# Altium footprint library Circuitos Integrados.PcbLib: 81 footprints (part 5 of 6)
Each footprint in its own frame and in the unit in brackets; x right, y up, seen from the top. Pads: shape width x height; smd on the part's side, far side on the other; paste and mask are expansions set on the pad; w line width, h text height; cw(c..) or ccw(c..) is an arc to the next point about the centre after c.
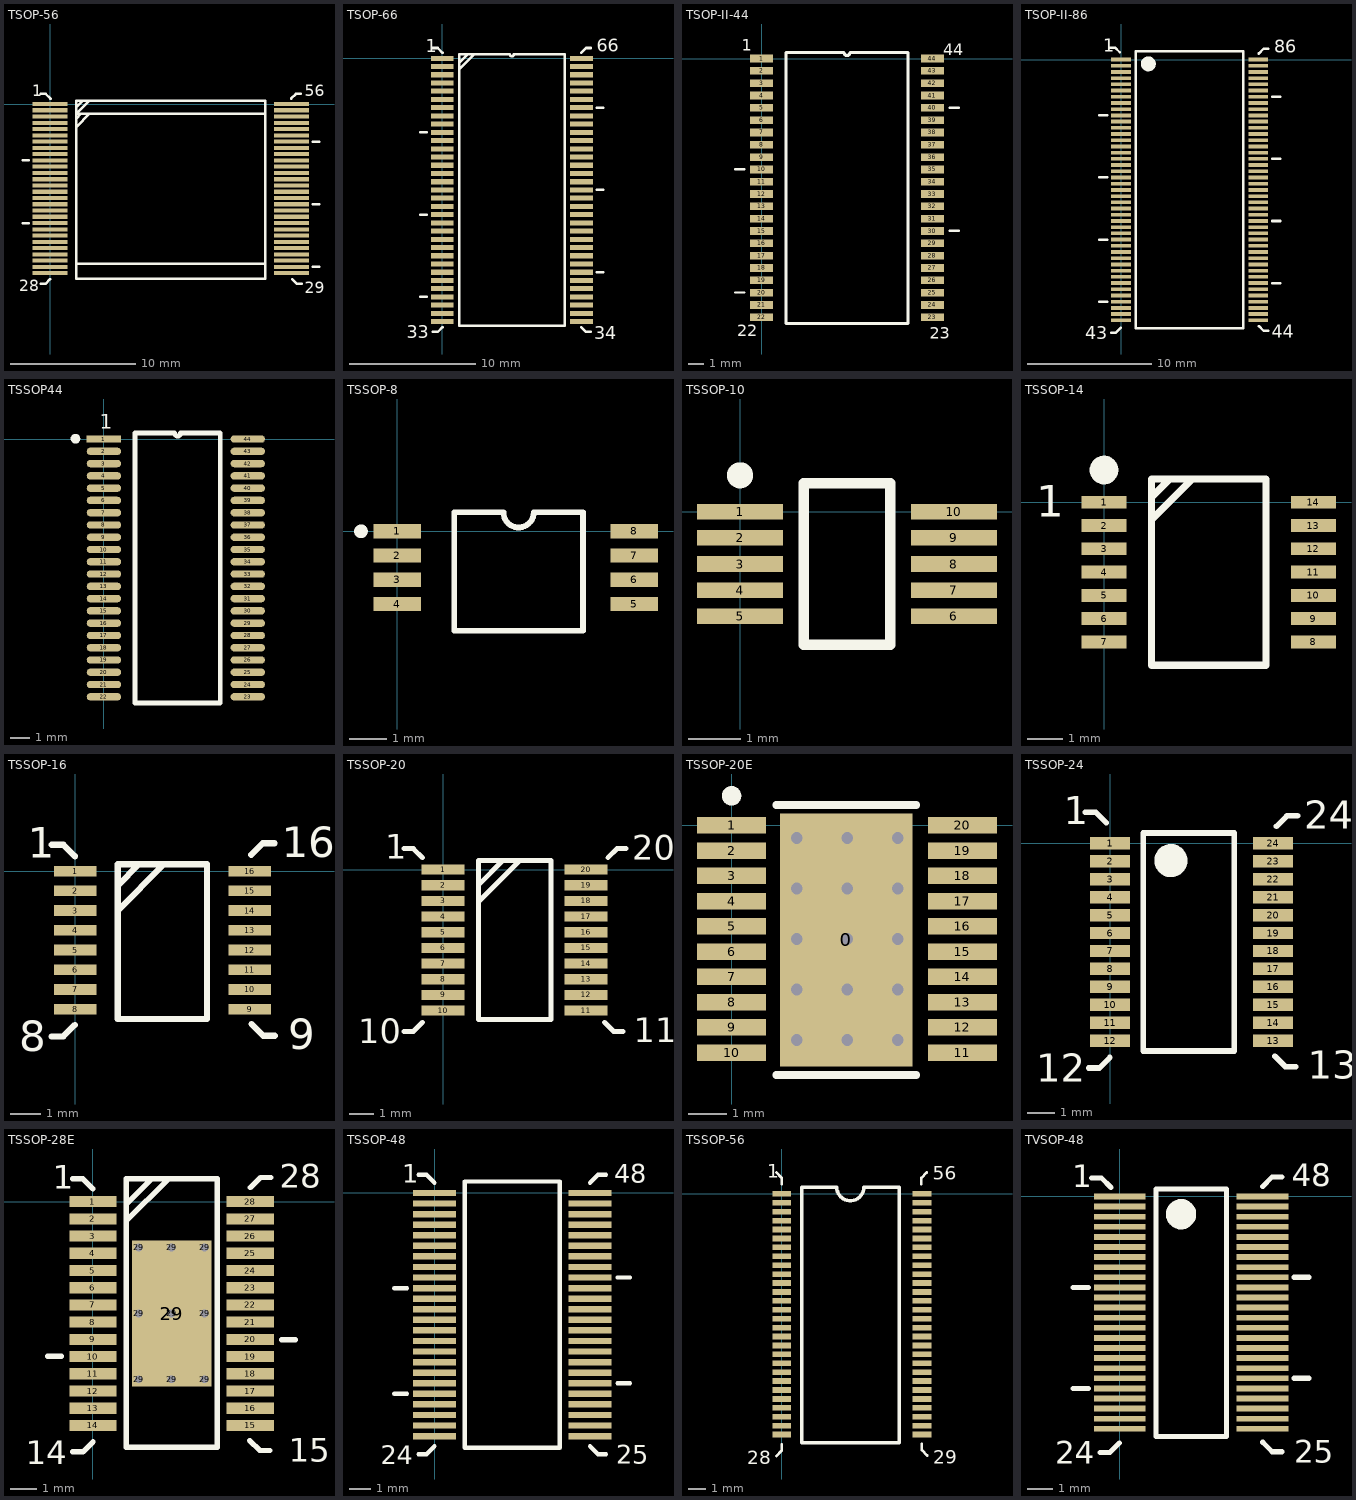
[diagram p4: the footprints below, top view; thin cyan lines are the x and y axes]

## TSOP-56 [mm]
pads (56):
  rect 2.8x0.33 smd: 1(0,0) 2(0,-0.5) 3(0,-1) 4(0,-1.5) 5(0,-2) 6(0,-2.5) 7(0,-3) 8(0,-3.5) 9(0,-4) 10(0,-4.5) 11(0,-5) 12(0,-5.5) 13(0,-6) 14(0,-6.5) 15(0,-7) 16(0,-7.5) 17(0,-8) 18(0,-8.5) 19(0,-9) 20(0,-9.5) 21(0,-10) 22(0,-10.5) 23(0,-11) 24(0,-11.5) 25(0,-12) 26(0,-12.5) 27(0,-13) 28(0,-13.5) 29(19.25,-13.5) 30(19.25,-13) 31(19.25,-12.5) 32(19.25,-12) 33(19.25,-11.5) 34(19.25,-11) 35(19.25,-10.5) 36(19.25,-10) 37(19.25,-9.5) 38(19.25,-9) 39(19.25,-8.5) 40(19.25,-8) 41(19.25,-7.5) 42(19.25,-7) 43(19.25,-6.5) 44(19.25,-6) 45(19.25,-5.5) 46(19.25,-5) 47(19.25,-4.5) 48(19.25,-4) 49(19.25,-3.5) 50(19.25,-3) 51(19.25,-2.5) 52(19.25,-2) 53(19.25,-1.5) 54(19.25,-1) 55(19.25,-0.5) 56(19.25,0)
Top Overlay:
  lines w0.203: -2.204,-9.5 -1.696,-9.5 ; -2.204,-4.5 -1.696,-4.5 ; -0.762,-14.351 -0.381,-14.351 0,-13.97 ; -0.737,0.813 -0.356,0.813 0.025,0.432 ; 2.085,-1.829 3.142,-0.772 ; 2.085,-1.168 2.481,-0.772 ; 2.085,-0.254 2.593,0.254 ; 2.093,-12.741 17.104,-12.741 ; 3.101,0.254 2.085,-0.762 17.146,-0.762 ; 17.145,0.254 2.085,0.25 2.085,-11.75 2.083,-13.945 17.17,-13.945 17.165,-11.75 17.165,0.25 ; 19.225,0.432 19.606,0.813 19.987,0.813 ; 19.304,-13.97 19.685,-14.351 20.066,-14.351 ; 20.946,-13 21.454,-13 ; 20.946,-8 21.454,-8 ; 20.946,-3 21.454,-3
  text "56" at 20.32,0.635 h0.89
  text "29" at 20.32,-15.088 h0.89
  text "1" at -1.422,0.635 h0.89
  text "28" at -2.489,-14.961 h0.89
3D body "TSOP-48.STEP": height 1.2, standoff -0.06, extent -0.65,-12.8 19.45,-0.7

## TSOP-66 [mm]
pads (66):
  rect 1.8x0.4 smd: 1(0,0) 2(0,-0.65) 3(0,-1.3) 4(0,-1.95) 5(0,-2.6) 6(0,-3.25) 7(0,-3.9) 8(0,-4.55) 9(0,-5.2) 10(0,-5.85) 11(0,-6.5) 12(0,-7.15) 13(0,-7.8) 14(0,-8.45) 15(0,-9.1) 16(0,-9.75) 17(0,-10.4) 18(0,-11.05) 19(0,-11.7) 20(0,-12.35) 21(0,-13) 22(0,-13.65) 23(0,-14.3) 24(0,-14.95) 25(0,-15.6) 26(0,-16.25) 27(0,-16.9) 28(0,-17.55) 29(0,-18.2) 30(0,-18.85) 31(0,-19.5) 32(0,-20.15) 33(0,-20.8) 34(11,-20.8) 35(11,-20.15) 36(11,-19.5) 37(11,-18.85) 38(11,-18.2) 39(11,-17.55) 40(11,-16.9) 41(11,-16.25) 42(11,-15.6) 43(11,-14.95) 44(11,-14.3) 45(11,-13.65) 46(11,-13) 47(11,-12.35) 48(11,-11.7) 49(11,-11.05) 50(11,-10.4) 51(11,-9.75) 52(11,-9.1) 53(11,-8.45) 54(11,-7.8) 55(11,-7.15) 56(11,-6.5) 57(11,-5.85) 58(11,-5.2) 59(11,-4.55) 60(11,-3.9) 61(11,-3.25) 62(11,-2.6) 63(11,-1.95) 64(11,-1.3) 65(11,-0.65) 66(11,0)
Top Overlay:
  lines w0.2: 1.335,-0.88 2.54,0.325 ; 1.335,-0.372 2.032,0.325 ; 1.335,-21.125 9.665,-21.125 9.665,0.325 5.662,0.325 cw(c5.5,0.325) 5.337,0.325 1.335,0.325 1.335,-21.125
  lines w0.203: -1.722,-18.85 -1.214,-18.85 ; -1.722,-12.35 -1.214,-12.35 ; -1.722,-5.85 -1.214,-5.85 ; -0.737,-21.613 -0.356,-21.613 0.025,-21.232 ; -0.737,0.813 -0.356,0.813 0.025,0.432 ; 10.975,-21.232 11.356,-21.613 11.737,-21.613 ; 10.975,0.432 11.356,0.813 11.737,0.813 ; 12.214,-16.9 12.722,-16.9 ; 12.214,-10.4 12.722,-10.4 ; 12.214,-3.9 12.722,-3.9
  text "66" at 12.192,0.508 h1.02
  text "34" at 12.014,-22.174 h1.02
  text "1" at -1.295,0.483 h1.02
  text "33" at -2.819,-22.123 h1.02
3D body "TSOP-66.STEP": height 1.2, standoff 0, extent -0.355,-21.545 11.405,0.675

## TSOP-II-44 [mm]
pads (44):
  rect 1.5x0.5 smd: 1(0,0) 2(0,-0.8) 3(0,-1.6) 4(0,-2.4) 5(0,-3.2) 6(0,-4) 7(0,-4.8) 8(0,-5.6) 9(0,-6.4) 10(0,-7.2) 11(0,-8) 12(0,-8.8) 13(0,-9.6) 14(0,-10.4) 15(0,-11.2) 16(0,-12) 17(0,-12.8) 18(0,-13.6) 19(0,-14.4) 20(0,-15.2) 21(0,-16) 22(0,-16.8) 23(11.1,-16.8) 24(11.1,-16) 25(11.1,-15.2) 26(11.1,-14.4) 27(11.1,-13.6) 28(11.1,-12.8) 29(11.1,-12) 30(11.1,-11.2) 31(11.1,-10.4) 32(11.1,-9.6) 33(11.1,-8.8) 34(11.1,-8) 35(11.1,-7.2) 36(11.1,-6.4) 37(11.1,-5.6) 38(11.1,-4.8) 39(11.1,-4) 40(11.1,-3.2) 41(11.1,-2.4) 42(11.1,-1.6) 43(11.1,-0.8) 44(11.1,0)
Top Overlay:
  lines w0.152: -1.727,-15.188 -1.118,-15.188 ; -1.727,-7.188 -1.118,-7.188 ; 12.218,-11.188 12.827,-11.188 ; 12.218,-3.188 12.827,-3.188
  lines w0.2: 1.585,-17.2 9.515,-17.2 9.515,0.4 5.75,0.4 cw(c5.55,0.4) 5.35,0.4 1.585,0.4 1.585,-17.2
  text "1" at -1.27,0.508 h0.76
  text "22" at -1.575,-18.034 h0.76
  text "44" at 11.786,0.229 h0.76
  text "23" at 10.922,-18.212 h0.76
3D body "User Library-44L-TSOP2.step": height 1.08, standoff -0.02, extent -0.285,-17.61 11.475,0.81

## TSOP-II-86 [mm] "TSSOP, 86-Leads, Body 22,3x10,2mm (max), Pitch 0,50mm, IPC Medium Density"
height 1.2
pads (86):
  rect 1.6x0.3 smd: 1(0,0) 2(0,-0.5) 3(0,-1) 4(0,-1.5) 5(0,-2) 6(0,-2.5) 7(0,-3) 8(0,-3.5) 9(0,-4) 10(0,-4.5) 11(0,-5) 12(0,-5.5) 13(0,-6) 14(0,-6.5) 15(0,-7) 16(0,-7.5) 17(0,-8) 18(0,-8.5) 19(0,-9) 20(0,-9.5) 21(0,-10) 22(0,-10.5) 23(0,-11) 24(0,-11.5) 25(0,-12) 26(0,-12.5) 27(0,-13) 28(0,-13.5) 29(0,-14) 30(0,-14.5) 31(0,-15) 32(0,-15.5) 33(0,-16) 34(0,-16.5) 35(0,-17) 36(0,-17.5) 37(0,-18) 38(0,-18.5) 39(0,-19) 40(0,-19.5) 41(0,-20) 42(0,-20.5) 43(0,-21) 44(11.05,-21) 45(11.05,-20.5) 46(11.05,-20) 47(11.05,-19.5) 48(11.05,-19) 49(11.05,-18.5) 50(11.05,-18) 51(11.05,-17.5) 52(11.05,-17) 53(11.05,-16.5) 54(11.05,-16) 55(11.05,-15.5) 56(11.05,-15) 57(11.05,-14.5) 58(11.05,-14) 59(11.05,-13.5) 60(11.05,-13) 61(11.05,-12.5) 62(11.05,-12) 63(11.05,-11.5) 64(11.05,-11) 65(11.05,-10.5) 66(11.05,-10) 67(11.05,-9.5) 68(11.05,-9) 69(11.05,-8.5) 70(11.05,-8) 71(11.05,-7.5) 72(11.05,-7) 73(11.05,-6.5) 74(11.05,-6) 75(11.05,-5.5) 76(11.05,-5) 77(11.05,-4.5) 78(11.05,-4) 79(11.05,-3.5) 80(11.05,-3) 81(11.05,-2.5) 82(11.05,-2) 83(11.05,-1.5) 84(11.05,-1) 85(11.05,-0.5) 86(11.05,0)
Top Overlay:
  circle w0.6: c2.2,-0.35 r0.3
  lines w0.2: 1.2,-21.65 9.85,-21.65 9.85,0.65 1.2,0.65 1.2,-21.65
  lines w0.203: -1.753,-19.496 -1.118,-19.496 ; -1.753,-14.496 -1.118,-14.496 ; -1.753,-9.496 -1.118,-9.496 ; -1.753,-4.496 -1.118,-4.496 ; -0.864,0.965 -0.483,0.965 -0.102,0.584 ; -0.787,-21.994 -0.406,-21.994 -0.025,-21.613 ; 11.102,-21.46 11.483,-21.841 11.864,-21.841 ; 11.102,0.483 11.483,0.864 11.864,0.864 ; 12.168,-18.004 12.803,-18.004 ; 12.168,-13.004 12.803,-13.004 ; 12.168,-8.004 12.803,-8.004 ; 12.168,-3.004 12.803,-3.004
  text "86" at 12.319,0.559 h1.02
  text "44" at 12.141,-22.403 h1.02
  text "1" at -1.422,0.635 h1.02
  text "43" at -2.87,-22.504 h1.02
3D body "User Library-TSOP-86.STEP": height 1.06, standoff -0.03, extent -0.359,-21.487 11.43,0.507

## TSSOP44 [mil]
pads (44):
  rect 70x15 smd: 1(0,0)
  oval 70x15 smd: 2(0,-25) 3(0,-50) 4(0,-75) 5(0,-100) 6(0,-125) 7(0,-150) 8(0,-175) 9(0,-200) 10(0,-225) 11(0,-250) 12(0,-275) 13(0,-300) 14(0,-325) 15(0,-350) 16(0,-375) 17(0,-400) 18(0,-425) 19(0,-450) 20(0,-475) 21(0,-500) 22(0,-525) 23(293,-525) 24(293,-500) 25(293,-475) 26(293,-450) 27(293,-425) 28(293,-400) 29(293,-375) 30(293,-350) 31(293,-325) 32(293,-300) 33(293,-275) 34(293,-250) 35(293,-225) 36(293,-200) 37(293,-175) 38(293,-150) 39(293,-125) 40(293,-100) 41(293,-75) 42(293,-50) 43(293,-25) 44(293,0)
Top Overlay:
  circle w9.84: c-58,0.68 r4.92
  lines w10: 63,-537.5 237,-537.5 237,12.5 156.25,12.5 cw(c150,12.5) 143.75,12.5 63,12.5 63,-537.5
  text "1" at -8,21 h30
3D body "User Library-HTSSOP44-0_65.STEP": height 47.24, standoff 0, extent -17,-539.56 309.77,15.55

## TSSOP-8 [mil] "TSSOP, 8-Leads, Body 3,1x4,5mm (max), Pitch 0,65mm, IPC Low Density"
height 43.31
pads (8):
  rect 50x15 smd: 1(0,0) 2(0,-25.6) 3(0,-51.2) 4(0,-76.8) 5(250,-76.8) 6(250,-51.2) 7(250,-25.6) 8(250,0)
Top Overlay:
  circle w8: c-38.16,0 r3.16
  lines w6: 60,19 60,-105 196,-105 196,19 ; 60,20 112,20 ccw(c128,20) 144,20 196,20
3D body "TSS0P8-1.STEP": height 43, standoff 0, extent 2.38,-101.11 249.62,17

## TSSOP-10 [mm]
height 1.1
pads (10):
  rect 1.65x0.3 smd: 1(0,0) 2(0,-0.5) 3(0,-1) 4(0,-1.5) 5(0,-2) 6(4.1,-2) 7(4.1,-1.5) 8(4.1,-1) 9(4.1,-0.5) 10(4.1,0)
Top Overlay:
  circle w0.25: c0,0.7 r0.125
  lines w0.2: 1.225,-2.55 2.875,-2.55 2.875,0.55 1.225,0.55 1.225,-2.55
3D body "SW3dPS-TSSOP-10.STEP": height 1.1, standoff 0, extent -0.45,-2.5 4.55,0.5

## TSSOP-14 [mm] "TSSOP, 14-Leads, Pitch 0.65mm"
pads (14):
  rect 1.26x0.36 smd: 1(0,0) 2(0,-0.65) 3(0,-1.3) 4(0,-1.95) 5(0,-2.6) 6(0,-3.25) 7(0,-3.9) 8(5.85,-3.9) 9(5.85,-3.25) 10(5.85,-2.6) 11(5.85,-1.95) 12(5.85,-1.3) 13(5.85,-0.65) 14(5.85,0)
Top Overlay:
  circle w0.4: c0,0.9 r0.2
  lines w0.203: 1.325,-0.493 2.468,0.65 ; 1.325,0.142 1.833,0.65 ; 1.325,-4.55 1.325,0.65 4.525,0.65 4.525,-4.55 1.325,-4.55
  text "1" at -1.9,-0.4 h0.89
3D body "SW3dPS-TSSOP14-1.STEP": height 1.1, standoff 0, extent -0.279,-4.445 6.121,0.555

## TSSOP-16 [mm] "THIN SHRINK SMALL OTLINE PACKAGE; 16 LEADS"
pads (16):
  rect 1.4x0.35 smd: 1(0,0) 2(0,-0.65) 3(0,-1.3) 4(0,-1.95) 5(0,-2.6) 6(0,-3.25) 7(0,-3.9) 8(0,-4.55) 9(5.75,-4.55) 10(5.75,-3.9) 11(5.75,-3.25) 12(5.75,-2.6) 13(5.75,-1.95) 14(5.75,-1.3) 15(5.75,-0.65) 16(5.75,0)
Top Overlay:
  lines w0.203: -0.773,-5.449 -0.392,-5.449 -0.011,-5.068 ; -0.773,0.869 -0.392,0.869 -0.011,0.488 ; 1.397,-1.3 2.922,0.225 ; 1.397,-0.475 2.097,0.225 ; 5.798,0.539 6.179,0.92 6.56,0.92 ; 5.811,-5.042 6.192,-5.423 6.573,-5.423 ; 1.397,-4.875 1.397,0.225 4.343,0.225 4.343,-4.875 1.397,-4.875
  text "9" at 7.014,-5.871 h1.02
  text "16" at 6.811,0.453 h1.02
  text "8" at -1.854,-5.944 h1.02
  text "1" at -1.561,0.437 h1.02
3D body "User Library-TSSOP-16 5_1x4_4.STEP": height 1.1, standoff 0, extent -0.33,-4.821 6.07,0.279

## TSSOP-20 [mm] "TSSOP, 20-Leads, Pitch 0.65mm"
height 1.05
pads (20):
  rect 1.78x0.42 smd: 1(0,0) 2(0,-0.65) 3(0,-1.3) 4(0,-1.95) 5(0,-2.6) 6(0,-3.25) 7(0,-3.9) 8(0,-4.55) 9(0,-5.2) 10(0,-5.85) 11(5.94,-5.85) 12(5.94,-5.2) 13(5.94,-4.55) 14(5.94,-3.9) 15(5.94,-3.25) 16(5.94,-2.6) 17(5.94,-1.95) 18(5.94,-1.3) 19(5.94,-0.65) 20(5.94,0)
Top Overlay:
  lines w0.203: -1.612,-6.719 -1.231,-6.719 -0.85,-6.338 ; -1.612,0.869 -1.231,0.869 -0.85,0.488 ; 1.476,-1.325 3.176,0.375 ; 1.476,-0.625 2.476,0.375 ; 6.7,-6.338 7.081,-6.719 7.462,-6.719 ; 6.84,0.488 7.221,0.869 7.602,0.869 ; 1.476,-6.225 4.476,-6.225 4.476,0.375 1.476,0.375 1.476,-6.225
  text "1" at -2.399,0.437 h1.02
  text "10" at -3.527,-7.218 h1.02
  text "20" at 7.853,0.402 h1.02
  text "11" at 7.903,-7.167 h1.02
3D body "TSSOP-20.STEP": height 0.97, standoff -0.03, extent -0.229,-6.171 6.181,0.329

## TSSOP-20E [mm] "TSSOP, 20-Leads, Pitch 0,65mm, With Thermal Pad"
height 1.1
pads (21):
  rect 3.4x6.5 smd paste-1016 mask-10.16: 0(2.95,-2.95)
  rect 1.78x0.42 smd: 1(0,0) 2(0,-0.65) 3(0,-1.3) 4(0,-1.95) 5(0,-2.6) 6(0,-3.25) 7(0,-3.9) 8(0,-4.55) 9(0,-5.2) 10(0,-5.85) 11(5.94,-5.85) 12(5.94,-5.2) 13(5.94,-4.55) 14(5.94,-3.9) 15(5.94,-3.25) 16(5.94,-2.6) 17(5.94,-1.95) 18(5.94,-1.3) 19(5.94,-0.65) 20(5.94,0)
via 1.675,-0.325 diameter 0.559 hole 0.3
via 2.975,-0.325 diameter 0.559 hole 0.3
via 4.275,-0.325 diameter 0.559 hole 0.3
via 4.275,-1.625 diameter 0.559 hole 0.3
via 2.975,-1.625 diameter 0.559 hole 0.3
via 1.675,-1.625 diameter 0.559 hole 0.3
via 1.675,-2.925 diameter 0.559 hole 0.3
via 2.975,-2.925 diameter 0.559 hole 0.3
via 4.275,-2.925 diameter 0.559 hole 0.3
via 1.675,-4.225 diameter 0.559 hole 0.3
via 2.975,-4.225 diameter 0.559 hole 0.3
via 4.275,-4.225 diameter 0.559 hole 0.3
via 4.275,-5.525 diameter 0.559 hole 0.3
via 2.975,-5.525 diameter 0.559 hole 0.3
via 1.675,-5.525 diameter 0.559 hole 0.3
Top Overlay:
  circle w0.25: c0,0.76 r0.125
  lines w0.2: 1.15,-6.425 4.75,-6.425 ; 1.15,0.525 4.75,0.525
Top Paste:
  region: 4.175,-4.725 4.175,-1.025 1.775,-1.025 1.775,-4.725
Top Solder:
  rectangle: 1.775,-4.725 4.175,-1.025
3D body "TSSOP20_TP.STEP": height 1.1, standoff -0.09, extent -0.165,-6.275 6.115,0.225

## TSSOP-24 [mm] "TSSOP, 24-Leads, Body 7,9x4,5mm (max), Pitch 0,65mm, IPC Medium Density"
height 1.2
pads (24):
  rect 1.45x0.45 smd: 1(0,0) 2(0,-0.65) 3(0,-1.3) 4(0,-1.95) 5(0,-2.6) 6(0,-3.25) 7(0,-3.9) 8(0,-4.55) 9(0,-5.2) 10(0,-5.85) 11(0,-6.5) 12(0,-7.15) 13(5.9,-7.15) 14(5.9,-6.5) 15(5.9,-5.85) 16(5.9,-5.2) 17(5.9,-4.55) 18(5.9,-3.9) 19(5.9,-3.25) 20(5.9,-2.6) 21(5.9,-1.95) 22(5.9,-1.3) 23(5.9,-0.65) 24(5.9,0)
Top Overlay:
  circle w0.6: c2.2,-0.625 r0.3
  lines w0.2: 1.2,-7.525 4.5,-7.525 4.5,0.375 1.2,0.375 1.2,-7.525
  lines w0.203: -0.9,1.123 -0.519,1.123 -0.138,0.742 ; -0.773,-8.141 -0.392,-8.141 -0.011,-7.76 ; 5.963,-7.709 6.344,-8.09 6.725,-8.09 ; 6.027,0.615 6.408,0.996 6.789,0.996
  text "1" at -1.688,0.691 h1.02
  text "12" at -2.688,-8.64 h1.02
  text "24" at 7.04,0.529 h1.02
  text "13" at 7.167,-8.538 h1.02
3D body "SW3dPS-AD8400 TSSOP.STEP": height 1.15, standoff -0.03, extent -0.26,-7.526 6.147,0.364

## TSSOP-28E [mm] "TSSOP, 28-Leads, Body 9.8x4.5mm (max), Pitch 0,65mm, Exp PAD"
pads (38):
  rect 1.78x0.42 smd mask+0.076: 1(0,0) 2(0,-0.65) 3(0,-1.3) 4(0,-1.95) 5(0,-2.6) 6(0,-3.25) 7(0,-3.9) 8(0,-4.55) 9(0,-5.2) 10(0,-5.85) 11(0,-6.5) 12(0,-7.15) 13(0,-7.8) 14(0,-8.45) 15(5.94,-8.45) 16(5.94,-7.8) 17(5.94,-7.15) 18(5.94,-6.5) 19(5.94,-5.85) 20(5.94,-5.2) 21(5.94,-4.55) 22(5.94,-3.9) 23(5.94,-3.25) 24(5.94,-2.6) 25(5.94,-1.95) 26(5.94,-1.3) 27(5.94,-0.65) 28(5.94,0)
  round 0.5 hole 0.3: 29(1.727,-6.706) 29(1.727,-4.216) 29(1.727,-1.727) 29(2.972,-6.706) 29(2.972,-4.216) 29(2.972,-1.727) 29(4.216,-6.706) 29(4.216,-4.216) 29(4.216,-1.727)
  rect 3x5.5 smd paste-200 mask+0.076: 29(2.971,-4.223)
Top Overlay:
  lines w0.203: -1.702,-5.842 -1.194,-5.842 ; -0.762,-9.449 -0.381,-9.449 0,-9.068 ; -0.762,0.864 -0.381,0.864 0,0.483 ; 1.25,-0.737 2.85,0.864 ; 1.25,-0.102 2.215,0.864 ; 5.918,-9.017 6.299,-9.398 6.68,-9.398 ; 5.944,0.533 6.325,0.914 6.706,0.914 ; 7.134,-5.208 7.642,-5.208 ; 1.25,-9.271 1.25,0.864 4.699,0.864 4.699,-9.271 1.25,-9.271
  text "15" at 7.391,-9.83 h0.89
  text "14" at -2.54,-9.906 h0.89
  text "28" at 7.061,0.533 h0.89
  text "1" at -1.524,0.483 h0.89
Top Paste:
  rectangle: 1.905,-4.039 2.794,-1.905
  rectangle: 3.15,-4.039 4.039,-1.905
  rectangle: 1.905,-6.528 2.794,-4.394
  rectangle: 3.15,-6.528 4.039,-4.394
3D body "User Library-TSSOP-28 9_8x4_4.STEP": height 1.1, standoff 0, extent -0.228,-9.114 6.172,0.686

## TSSOP-48 [mm] "TSSOP, 48-Leads, Body 12,6x6,2mm (max), Pitch 0,50mm"
height 1.2
pads (48):
  rect 2.05x0.3 smd: 1(0,0) 2(0,-0.5) 3(0,-1) 4(0,-1.5) 5(0,-2) 6(0,-2.5) 7(0,-3) 8(0,-3.5) 9(0,-4) 10(0,-4.5) 11(0,-5) 12(0,-5.5) 13(0,-6) 14(0,-6.5) 15(0,-7) 16(0,-7.5) 17(0,-8) 18(0,-8.5) 19(0,-9) 20(0,-9.5) 21(0,-10) 22(0,-10.5) 23(0,-11) 24(0,-11.5) 25(7.35,-11.5) 26(7.35,-11) 27(7.35,-10.5) 28(7.35,-10) 29(7.35,-9.5) 30(7.35,-9) 31(7.35,-8.5) 32(7.35,-8) 33(7.35,-7.5) 34(7.35,-7) 35(7.35,-6.5) 36(7.35,-6) 37(7.35,-5.5) 38(7.35,-5) 39(7.35,-4.5) 40(7.35,-4) 41(7.35,-3.5) 42(7.35,-3) 43(7.35,-2.5) 44(7.35,-2) 45(7.35,-1.5) 46(7.35,-1) 47(7.35,-0.5) 48(7.35,0)
Top Overlay:
  lines w0.2: 1.425,-12.05 1.425,0.55 5.925,0.55 5.925,-12.05 1.425,-12.05
  lines w0.203: -1.9,-9.5 -1.3,-9.5 ; -1.9,-4.5 -1.3,-4.5 ; -0.762,-12.364 -0.381,-12.364 0,-11.983 ; -0.762,0.864 -0.381,0.864 0,0.483 ; 7.35,-11.983 7.731,-12.364 8.112,-12.364 ; 7.35,0.483 7.731,0.864 8.112,0.864 ; 8.65,-9 9.25,-9 ; 8.65,-4 9.25,-4
  text "48" at 8.5,0.483 h0.89
  text "25" at 8.6,-12.8 h0.89
  text "24" at -2.54,-12.821 h0.89
  text "1" at -1.524,0.483 h0.89
3D body "SW3dPS-TSSOP-48.STEP": height 1.1, standoff 0, extent -0.367,-11.99 7.733,0.51

## TSSOP-56 [mm]
pads (56):
  rect 1.05x0.32 smd: 1(0,0) 2(0,-0.5) 3(0,-1) 4(0,-1.5) 5(0,-2) 6(0,-2.5) 7(0,-3) 8(0,-3.5) 9(0,-4) 10(0,-4.5) 11(0,-5) 12(0,-5.5) 13(0,-6) 14(0,-6.5) 15(0,-7) 16(0,-7.5) 17(0,-8) 18(0,-8.5) 19(0,-9) 20(0,-9.5) 21(0,-10) 22(0,-10.5) 23(0,-11) 24(0,-11.5) 25(0,-12) 26(0,-12.5) 27(0,-13) 28(0,-13.5) 29(7.87,-13.5) 30(7.87,-13) 31(7.87,-12.5) 32(7.87,-12) 33(7.87,-11.5) 34(7.87,-11) 35(7.87,-10.5) 36(7.87,-10) 37(7.87,-9.5) 38(7.87,-9) 39(7.87,-8.5) 40(7.87,-8) 41(7.87,-7.5) 42(7.87,-7) 43(7.87,-6.5) 44(7.87,-6) 45(7.87,-5.5) 46(7.87,-5) 47(7.87,-4.5) 48(7.87,-4) 49(7.87,-3.5) 50(7.87,-3) 51(7.87,-2.5) 52(7.87,-2) 53(7.87,-1.5) 54(7.87,-1) 55(7.87,-0.5) 56(7.87,0)
Top Overlay:
  lines w0.152: -0.3,-14.7 0,-14.4 0,-14.05 ; -0.3,1.2 0,0.9 0,0.55 ; 7.829,0.55 7.829,0.9 8.129,1.2 ; 7.854,-14.025 7.854,-14.375 8.154,-14.675
  lines w0.2: 3.083,0.381 ccw(c3.845,0.381) 4.607,0.381 6.579,0.381 6.579,-13.97 1.118,-13.97 1.118,0.381 3.089,0.381
  text "1" at -0.813,0.914 h0.76
  text "28" at -1.95,-15.15 h0.76
  text "29" at 8.504,-15.125 h0.76
  text "56" at 8.479,0.8 h0.76
3D body "SW3dPS-TSSOP-56.STEP": height 1.09, standoff -0.45, extent -0.144,-13.797 8.001,0.284

## TVSOP-48 [mm] "TVSOP, 48-Leads, Body 9,8x4,5mm (max), Pitch 0,40mm, IPC Low Density"
height 1.2
pads (48):
  rect 2.05x0.23 smd: 1(0,0) 2(0,-0.4) 3(0,-0.8) 4(0,-1.2) 5(0,-1.6) 6(0,-2) 7(0,-2.4) 8(0,-2.8) 9(0,-3.2) 10(0,-3.6) 11(0,-4) 12(0,-4.4) 13(0,-4.8) 14(0,-5.2) 15(0,-5.6) 16(0,-6) 17(0,-6.4) 18(0,-6.8) 19(0,-7.2) 20(0,-7.6) 21(0,-8) 22(0,-8.4) 23(0,-8.8) 24(0,-9.2) 25(5.65,-9.2) 26(5.65,-8.8) 27(5.65,-8.4) 28(5.65,-8) 29(5.65,-7.6) 30(5.65,-7.2) 31(5.65,-6.8) 32(5.65,-6.4) 33(5.65,-6) 34(5.65,-5.6) 35(5.65,-5.2) 36(5.65,-4.8) 37(5.65,-4.4) 38(5.65,-4) 39(5.65,-3.6) 40(5.65,-3.2) 41(5.65,-2.8) 42(5.65,-2.4) 43(5.65,-2) 44(5.65,-1.6) 45(5.65,-1.2) 46(5.65,-0.8) 47(5.65,-0.4) 48(5.65,0)
Top Overlay:
  circle w0.6: c2.425,-0.7 r0.3
  lines w0.2: 1.425,-9.5 4.225,-9.5 4.225,0.3 1.425,0.3 1.425,-9.5
  lines w0.203: -1.85,-7.6 -1.25,-7.6 ; -1.85,-3.6 -1.25,-3.6 ; -1.112,0.739 -0.731,0.739 -0.35,0.358 ; -0.777,-10.137 -0.396,-10.137 -0.015,-9.756 ; 5.659,-9.731 6.04,-10.112 6.421,-10.112 ; 5.659,0.398 6.04,0.779 6.421,0.779 ; 6.9,-7.2 7.5,-7.2 ; 6.9,-3.2 7.5,-3.2
  text "48" at 6.809,0.398 h0.89
  text "25" at 6.909,-10.548 h0.89
  text "24" at -2.555,-10.594 h0.89
  text "1" at -1.874,0.358 h0.89